# Altium footprint library ACTION_IC封装.PcbLib: 114 footprints (part 4 of 8)
Each footprint in its own frame and in the unit in brackets; x right, y up, seen from the top. Pads: shape width x height; smd on the part's side, far side on the other; paste and mask are expansions set on the pad; w line width, h text height; cw(c..) or ccw(c..) is an arc to the next point about the centre after c.
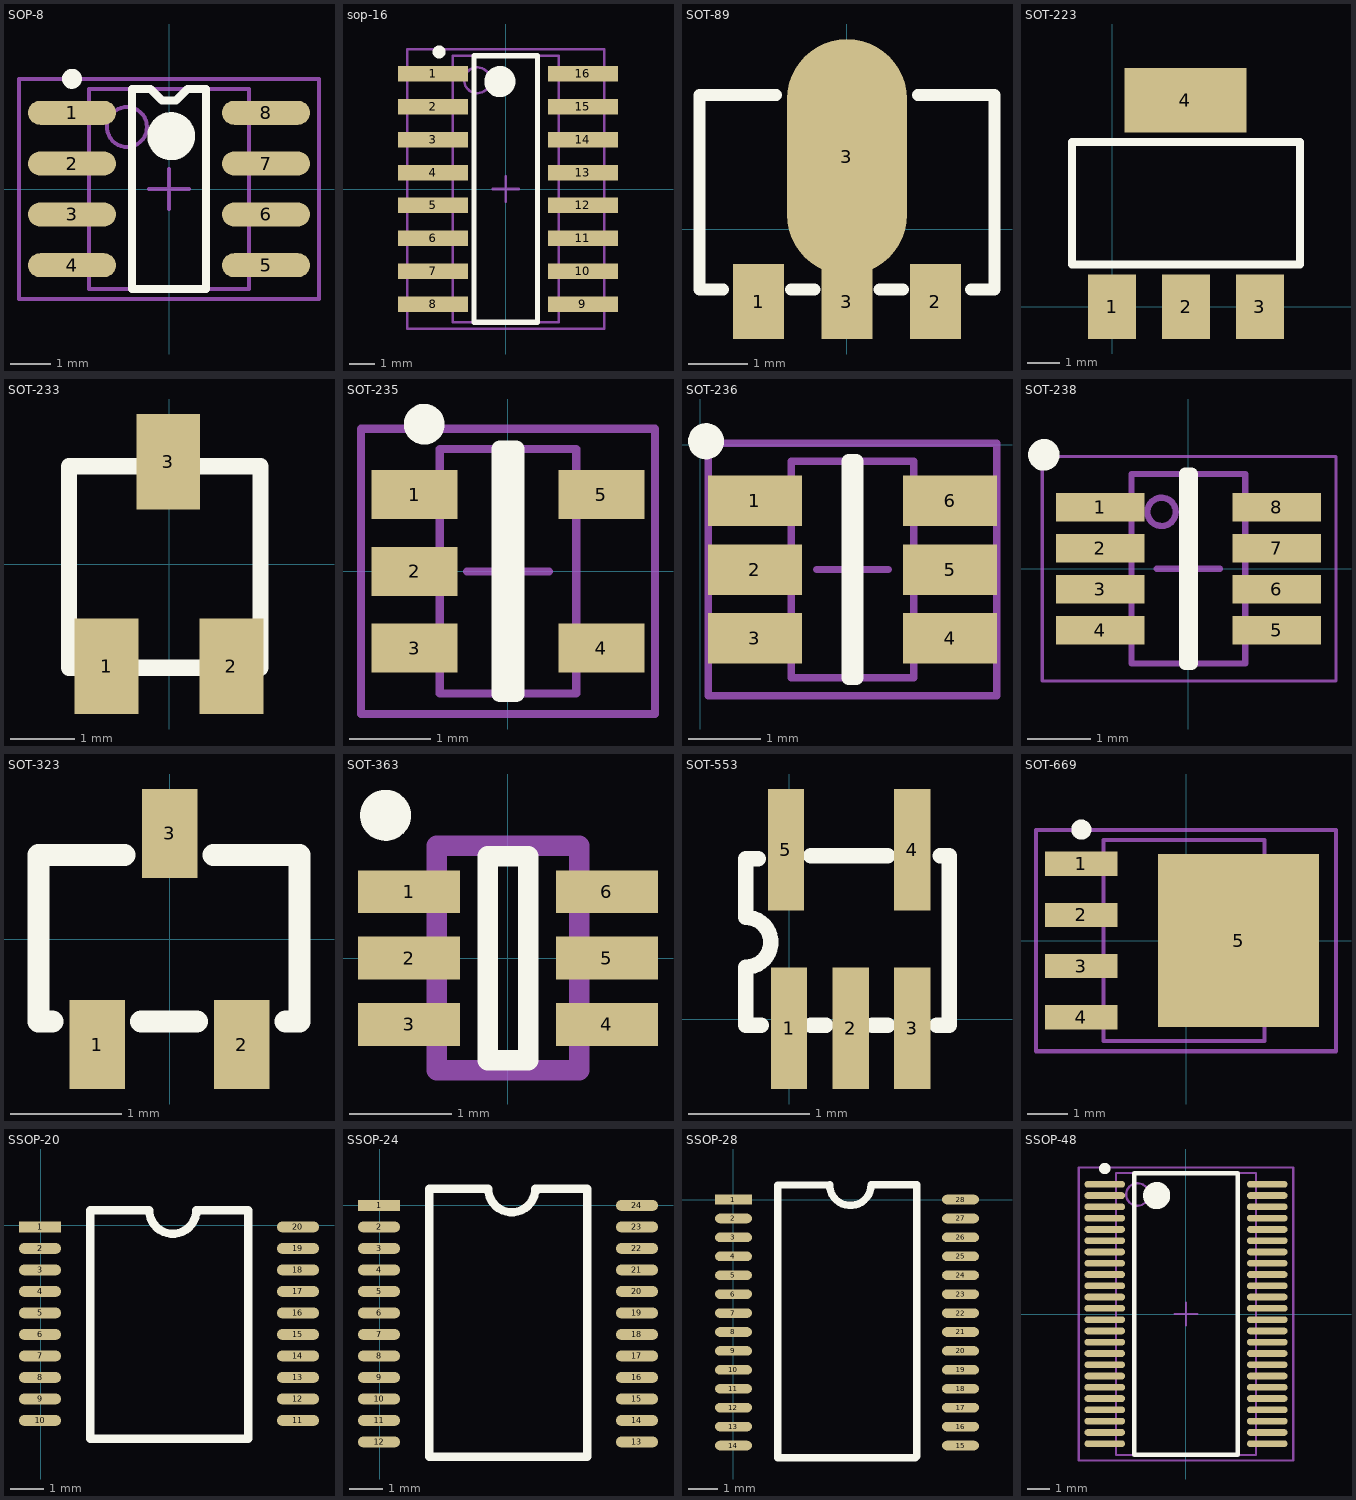
[diagram p3: the footprints below, top view; thin cyan lines are the x and y axes]

## SOP-8 [mm] "SOP, 8-Leads, Body 5.0x4.0mm (max), Pitch 1.27mm, IPC Medium Density"
height 1.75
pads (8):
  oval 2.2x0.6 smd: 1(-2.425,1.905) 2(-2.425,0.635) 3(-2.425,-0.635) 4(-2.425,-1.905) 5(2.425,-1.905) 6(2.425,-0.635) 7(2.425,0.635) 8(2.425,1.905)
Top Overlay:
  circle w0.6: c0.056,1.321 r0.3
  circle w0.25: c-2.425,2.755 r0.125
  lines w0.2: -0.925,-2.5 0.925,-2.5 0.925,2.5 0.463,2.5 0.172,2.21 -0.172,2.21 -0.462,2.5 -0.925,2.5 -0.925,-2.5
Mechanical 13:
  circle w0.1: c-1.05,1.55 r0.5
  lines w0.1: -2,-2.5 2,-2.5 2,2.5 -2,2.5 -2,-2.5
Mechanical 15:
  lines w0.1: -0.5,0 0.5,0 ; 0,-0.5 0,0.5 ; -3.75,-2.75 3.75,-2.75 3.75,2.75 -3.75,2.75 -3.75,-2.75
3D body "User Library-sop-8.STEP": height 1.6, standoff 0, extent -2.894,-2.485 3.148,2.535

## sop-16 [mm] "SOP, 16-Leads, Body 10.3x4.1mm (max), Pitch 1.27mm, IPC Medium Density"
height 1.8
pads (16):
  rect 2.7x0.6 smd: 1(-2.804,4.445) 2(-2.804,3.175) 3(-2.804,1.905) 4(-2.804,0.635) 5(-2.804,-0.635) 6(-2.804,-1.905) 7(-2.804,-3.175) 8(-2.804,-4.445) 9(2.981,-4.445) 10(2.981,-3.175) 11(2.981,-1.905) 12(2.981,-0.635) 13(2.981,0.635) 14(2.981,1.905) 15(2.981,3.175) 16(2.981,4.445)
Top Overlay:
  circle w0.6: c-0.225,4.15 r0.3
  circle w0.25: c-2.575,5.295 r0.125
  lines w0.2: -1.225,-5.15 1.225,-5.15 1.225,5.15 -1.225,5.15 -1.225,-5.15
Mechanical 13:
  circle w0.1: c-1.1,4.2 r0.5
  lines w0.1: -2.05,-5.15 2.05,-5.15 2.05,5.15 -2.05,5.15 -2.05,-5.15
Mechanical 15:
  lines w0.1: -0.5,0 0.5,0 ; 0,-0.5 0,0.5 ; -3.8,-5.4 3.8,-5.4 3.8,5.4 -3.8,5.4 -3.8,-5.4
3D body "User Library-User Library-TLP291-4(SOP16).STEP": height 2.1, standoff 0, extent -3.195,-5.201 3.805,5.099

## SOT-89 [mil]
pads (4):
  rect 34x50 smd: 1(-59.05,-48.27) 2(59.05,-48.27) 3(0,-48.27)
  oval 80x157.48 smd: 3(0,48.27)
Top Overlay:
  lines w7.87: -82.68,-40.31 -98.42,-40.31 -98.42,89.61 -47.24,89.61 ; 47.24,89.61 98.43,89.61 98.43,-40.31
  lines w8: -37.4,-40.31 -21.65,-40.31 ; 21.65,-40.31 37.4,-40.31 ; 82.68,-40.31 98.43,-40.31
3D body "SOT-89.STEP": height 59.45, standoff 0, extent -87.4,-59.45 89.76,109.84

## SOT-223 [mil]
pads (4):
  rect 59x79 smd: 1(0,0) 2(90.55,0) 3(181.1,0)
  rect 150x79 smd: 4(89.88,253.54)
Top Overlay:
  lines w10: -49.45,52 -49.45,202 230.55,202 230.55,52 -49.45,52
3D body "SOT223.STEP": height 65.04, standoff 0.08, extent -41.95,-11.79 213.96,263.8

## SOT-233 [mm]
pads (3):
  rect 1x1.5 smd: 1(-0.978,-1.6) 2(0.978,-1.6) 3(-0.013,1.6)
Top Overlay:
  lines w0.254: -1.567,-1.626 1.435,-1.626 1.435,1.533 -1.567,1.533 -1.567,-1.626
3D body "SOT-23A.STEP": height 1.2, standoff 0, extent -1.513,-1.29 1.387,1.51

## SOT-235 [mm] "SOT23, 5-Leads, Body 3.0x2.6mm (max), Pitch 0.95mm, IPC Medium Density"
height 1.22
pads (5):
  rect 1.05x0.6 smd: 1(-1.143,0.94) 2(-1.143,0) 3(-1.143,-0.94) 4(1.143,-0.94) 5(1.143,0.94)
Top Overlay:
  circle w0.25: c-1.025,1.8 r0.125
  lines w0.2: -0.1,-1.5 -0.1,1.5 0.1,1.5 0.1,-1.5 -0.1,-1.5
Mechanical 13:
  lines w0.1: -0.835,-1.495 0.835,-1.495 0.835,1.495 -0.835,1.495 -0.835,-1.495
Mechanical 15:
  lines w0.1: -0.5,0 0.5,0 ; 0,-0.5 0,0.5 ; -1.8,-1.745 1.8,-1.745 1.8,1.745 -1.8,1.745 -1.8,-1.745
3D body "SOT-23-5.STEP": height 1.2, standoff 0, extent -1.4,-1.501 1.4,1.399

## SOT-236 [mm]
height 0.6
pads (6):
  rect 1.3x0.7 smd: 1(0.756,-0.777) 2(0.756,-1.727) 3(0.756,-2.677) 4(3.461,-2.677) 5(3.461,-1.727) 6(3.461,-0.777)
Top Overlay:
  circle w0.25: c0.078,0.051 r0.125
  lines w0.2: 2.058,-3.227 2.158,-3.227 2.158,-0.227 2.058,-0.227 2.058,-3.227
Mechanical 13:
  lines w0.1: 1.258,-3.227 1.258,-0.227 2.958,-0.227 2.958,-3.227 1.258,-3.227
Mechanical 15:
  lines w0.1: 1.608,-1.727 2.608,-1.727 ; 2.108,-2.227 2.108,-1.227 ; 0.108,-3.477 0.108,0.023 4.108,0.023 4.108,-3.477 0.108,-3.477
3D body "User Library-sot236.STEP": height 1, standoff 0, extent 0.938,-3.289 3.278,-0.369

## SOT-238 [mm]
pads (8):
  rect 1.4x0.45 smd paste+0 mask+0.051: 1(-1.397,0.975) 2(-1.397,0.325) 3(-1.397,-0.325) 4(-1.397,-0.975) 5(1.397,-0.975) 6(1.397,-0.325) 7(1.397,0.325) 8(1.397,0.975)
Top Overlay:
  circle w0.25: c-2.286,1.803 r0.125
  lines w0.2: -0.05,-1.5 -0.05,1.5 0.05,1.5 0.05,-1.5 -0.05,-1.5
Mechanical 13:
  circle w0.1: c-0.424,0.9 r0.224
  lines w0.1: -0.9,-1.5 -0.9,1.5 0.9,1.5 0.9,-1.5 -0.9,-1.5
Mechanical 15:
  lines w0.05: -2.311,-1.778 -2.311,1.778 2.337,1.778 2.337,-1.778 -2.311,-1.778
  lines w0.1: -0.5,0 0.5,0 ; 0,-0.5 0,0.5
3D body: height 0.25, standoff 0, extent -0.94,-1.549 0.94,1.549

## SOT-323 [mm]
pads (3):
  rect 0.5x0.8 smd: 1(-0.65,-0.95) 2(0.65,-0.95) 3(0,0.95)
Top Overlay:
  lines w0.2: -1.055,-0.743 -1.18,-0.743 -1.18,0.757 -0.405,0.757 ; -0.255,-0.743 0.245,-0.743 ; 0.395,0.757 1.17,0.757 1.17,-0.743 1.045,-0.743
3D body "SOT323 (SC70-3)-1.STEP": height 1.1, standoff 0, extent -1.07,-1.162 1.13,1.083

## SOT-363 [mm]
pads (6):
  rect 1x0.42 smd mask+0.051: 1(-0.97,0.65) 2(-0.97,0) 3(-0.97,-0.65) 4(0.97,-0.65) 5(0.97,0) 6(0.97,0.65)
Top Overlay:
  circle w0.25: c-1.2,1.4 r0.125
  lines w0.2: -0.2,-1 -0.2,1 0.2,1 0.2,-1 -0.2,-1
Mechanical 13:
  lines w0.2: -0.7,-1.1 0.7,-1.1 0.7,1.1 -0.7,1.1 -0.7,-1.1
3D body "User Library-SOT363-2.STEP": height 1.1, standoff 0, extent -1.2,-1.1 1.2,1.1

## SOT-553 [mm]
pads (5):
  rect 0.3x1 smd: 1(0,-0.076) 2(0.508,-0.076) 3(1.016,-0.076) 4(1.016,1.397) 5(-0.025,1.397)
Top Overlay:
  lines w0.127: -0.254,1.321 -0.356,1.321 -0.356,0.838 cw(c-0.356,0.633) -0.356,0.429 -0.356,-0.051 -0.229,-0.051 ; 0.178,-0.051 0.305,-0.051 ; 0.178,1.346 0.813,1.346 ; 0.686,-0.051 0.813,-0.051 ; 1.219,-0.051 1.321,-0.051 1.321,1.346 1.245,1.346
3D body "User Library-sot-553.STEP": height 0.48, standoff -0.02, extent -0.279,-0.013 1.321,1.587

## SOT-669 [mm] "TO, 5-Pads, Body 4.0x5.0mm (max), IPC Medium Density"
height 1
pads (5):
  rect 1.8x0.6 smd: 1(-2.6,1.905) 2(-2.6,0.635) 3(-2.6,-0.635) 4(-2.6,-1.905)
  rect 4x4.3 smd: 5(1.306,0)
Top Overlay:
  circle w0.25: c-2.6,2.755 r0.125
Mechanical 13:
  lines w0.1: -2.05,-2.5 -2.05,2.5 1.95,2.5 1.95,-2.5 -2.05,-2.5
Mechanical 15:
  lines w0.1: -0.5,0 0.5,0 ; 0,-0.5 0,0.5 ; -3.725,-2.75 -3.725,2.75 3.725,2.75 3.725,-2.75 -3.725,-2.75
3D body "User Library-SOT669.STEP": height 1.2, standoff 0, extent -3.214,-2.475 3.553,2.525

## SSOP-20 [mm]
pads (20):
  rect 1.27x0.33 smd: 1(-0.025,-0.051)
  oval 1.27x0.33 smd: 2(-0.025,-0.701) 3(-0.025,-1.351) 4(-0.025,-2.001) 5(-0.025,-2.651) 6(-0.025,-3.301) 7(-0.025,-3.951) 8(-0.025,-4.601) 9(-0.025,-5.251) 10(-0.025,-5.901) 11(7.775,-5.901) 12(7.775,-5.251) 13(7.775,-4.601) 14(7.775,-3.951) 15(7.775,-3.301) 16(7.775,-2.651) 17(7.775,-2.001) 18(7.775,-1.351) 19(7.775,-0.701) 20(7.775,-0.051)
Top Overlay:
  lines w0.254: 6.223,-6.45 1.499,-6.45 1.499,0.449 3.269,0.449 3.277,0.457 ccw(c3.99,0.457) 4.703,0.457 6.266,0.457 6.274,0.449 6.274,-6.45
3D body "SSOP-20.STEP": height 2.04, standoff 0.05, extent -0.013,-6.637 7.887,0.693

## SSOP-24 [mm]
pads (24):
  rect 1.27x0.33 smd: 1(-0.025,0)
  oval 1.27x0.33 smd: 2(-0.025,-0.65) 3(-0.025,-1.3) 4(-0.025,-1.95) 5(-0.025,-2.6) 6(-0.025,-3.25) 7(-0.025,-3.9) 8(-0.025,-4.55) 9(-0.025,-5.2) 10(-0.025,-5.85) 11(-0.025,-6.5) 12(-0.025,-7.15) 13(7.775,-7.15) 14(7.775,-6.5) 15(7.775,-5.85) 16(7.775,-5.2) 17(7.775,-4.55) 18(7.775,-3.9) 19(7.775,-3.25) 20(7.775,-2.6) 21(7.775,-1.95) 22(7.775,-1.3) 23(7.775,-0.65) 24(7.775,0)
Top Overlay:
  lines w0.254: 6.223,-7.6 1.499,-7.6 1.499,0.5 3.269,0.5 3.277,0.508 ccw(c3.99,0.508) 4.703,0.508 6.266,0.508 6.274,0.5 6.274,-7.6
3D body "User Library-SSOP-24.STEP": height 1.9, standoff 0, extent -0.141,-7.758 7.659,0.442

## SSOP-28 [mm]
pads (28):
  rect 1.27x0.33 smd: 1(0,0)
  oval 1.27x0.33 smd: 2(0,-0.65) 3(0,-1.3) 4(0,-1.95) 5(0,-2.6) 6(0,-3.25) 7(0,-3.9) 8(0,-4.55) 9(0,-5.2) 10(0,-5.85) 11(0,-6.5) 12(0,-7.15) 13(0,-7.8) 14(0,-8.45) 15(7.8,-8.45) 16(7.8,-7.8) 17(7.8,-7.15) 18(7.8,-6.5) 19(7.8,-5.85) 20(7.8,-5.2) 21(7.8,-4.55) 22(7.8,-3.9) 23(7.8,-3.25) 24(7.8,-2.6) 25(7.8,-1.95) 26(7.8,-1.3) 27(7.8,-0.65) 28(7.8,0)
Top Overlay:
  lines w0.254: 1.524,-8.865 6.248,-8.865 6.299,-8.814 6.299,0.5 6.291,0.508 4.728,0.508 cw(c4.015,0.508) 3.302,0.508 3.294,0.5 1.524,0.5 1.524,-8.865
3D body "User Library-SSOP-28-3.STEP": height 1.9, standoff 0, extent 0.062,-9.342 7.862,0.858

## SSOP-48 [mm]
pads (48):
  oval 1.8x0.3 smd: 1(-3.6,5.75) 2(-3.6,5.25) 3(-3.6,4.75) 4(-3.6,4.25) 5(-3.6,3.75) 6(-3.6,3.25) 7(-3.6,2.75) 8(-3.6,2.25) 9(-3.6,1.75) 10(-3.6,1.25) 11(-3.6,0.75) 12(-3.6,0.25) 13(-3.6,-0.25) 14(-3.6,-0.75) 15(-3.6,-1.25) 16(-3.6,-1.75) 17(-3.6,-2.25) 18(-3.6,-2.75) 19(-3.6,-3.25) 20(-3.6,-3.75) 21(-3.6,-4.25) 22(-3.6,-4.75) 23(-3.6,-5.25) 24(-3.6,-5.75) 25(3.6,-5.75) 26(3.6,-5.25) 27(3.6,-4.75) 28(3.6,-4.25) 29(3.6,-3.75) 30(3.6,-3.25) 31(3.6,-2.75) 32(3.6,-2.25) 33(3.6,-1.75) 34(3.6,-1.25) 35(3.6,-0.75) 36(3.6,-0.25) 37(3.6,0.25) 38(3.6,0.75) 39(3.6,1.25) 40(3.6,1.75) 41(3.6,2.25) 42(3.6,2.75) 43(3.6,3.25) 44(3.6,3.75) 45(3.6,4.25) 46(3.6,4.75) 47(3.6,5.25) 48(3.6,5.75)
Top Overlay:
  circle w0.6: c-1.3,5.25 r0.3
  circle w0.25: c-3.6,6.45 r0.125
  lines w0.2: -2.3,-6.25 2.3,-6.25 2.3,6.25 -2.3,6.25 -2.3,-6.25
Mechanical 13:
  circle w0.1: c-2.15,5.3 r0.5
  lines w0.1: -3.1,-6.25 3.1,-6.25 3.1,6.25 -3.1,6.25 -3.1,-6.25
Mechanical 15:
  lines w0.1: -0.5,0 0.5,0 ; 0,-0.5 0,0.5 ; -4.75,-6.5 4.75,-6.5 4.75,6.5 -4.75,6.5 -4.75,-6.5
3D body: height 1.2, standoff 0.15, extent -3.1,-6.25 3.1,6.25